# Altium footprint library 16-PCBa Modl.PcbLib: 81 footprints (part 3 of 6)
Each footprint in its own frame and in the unit in brackets; x right, y up, seen from the top. Pads: shape width x height; smd on the part's side, far side on the other; paste and mask are expansions set on the pad; w line width, h text height; cw(c..) or ccw(c..) is an arc to the next point about the centre after c.
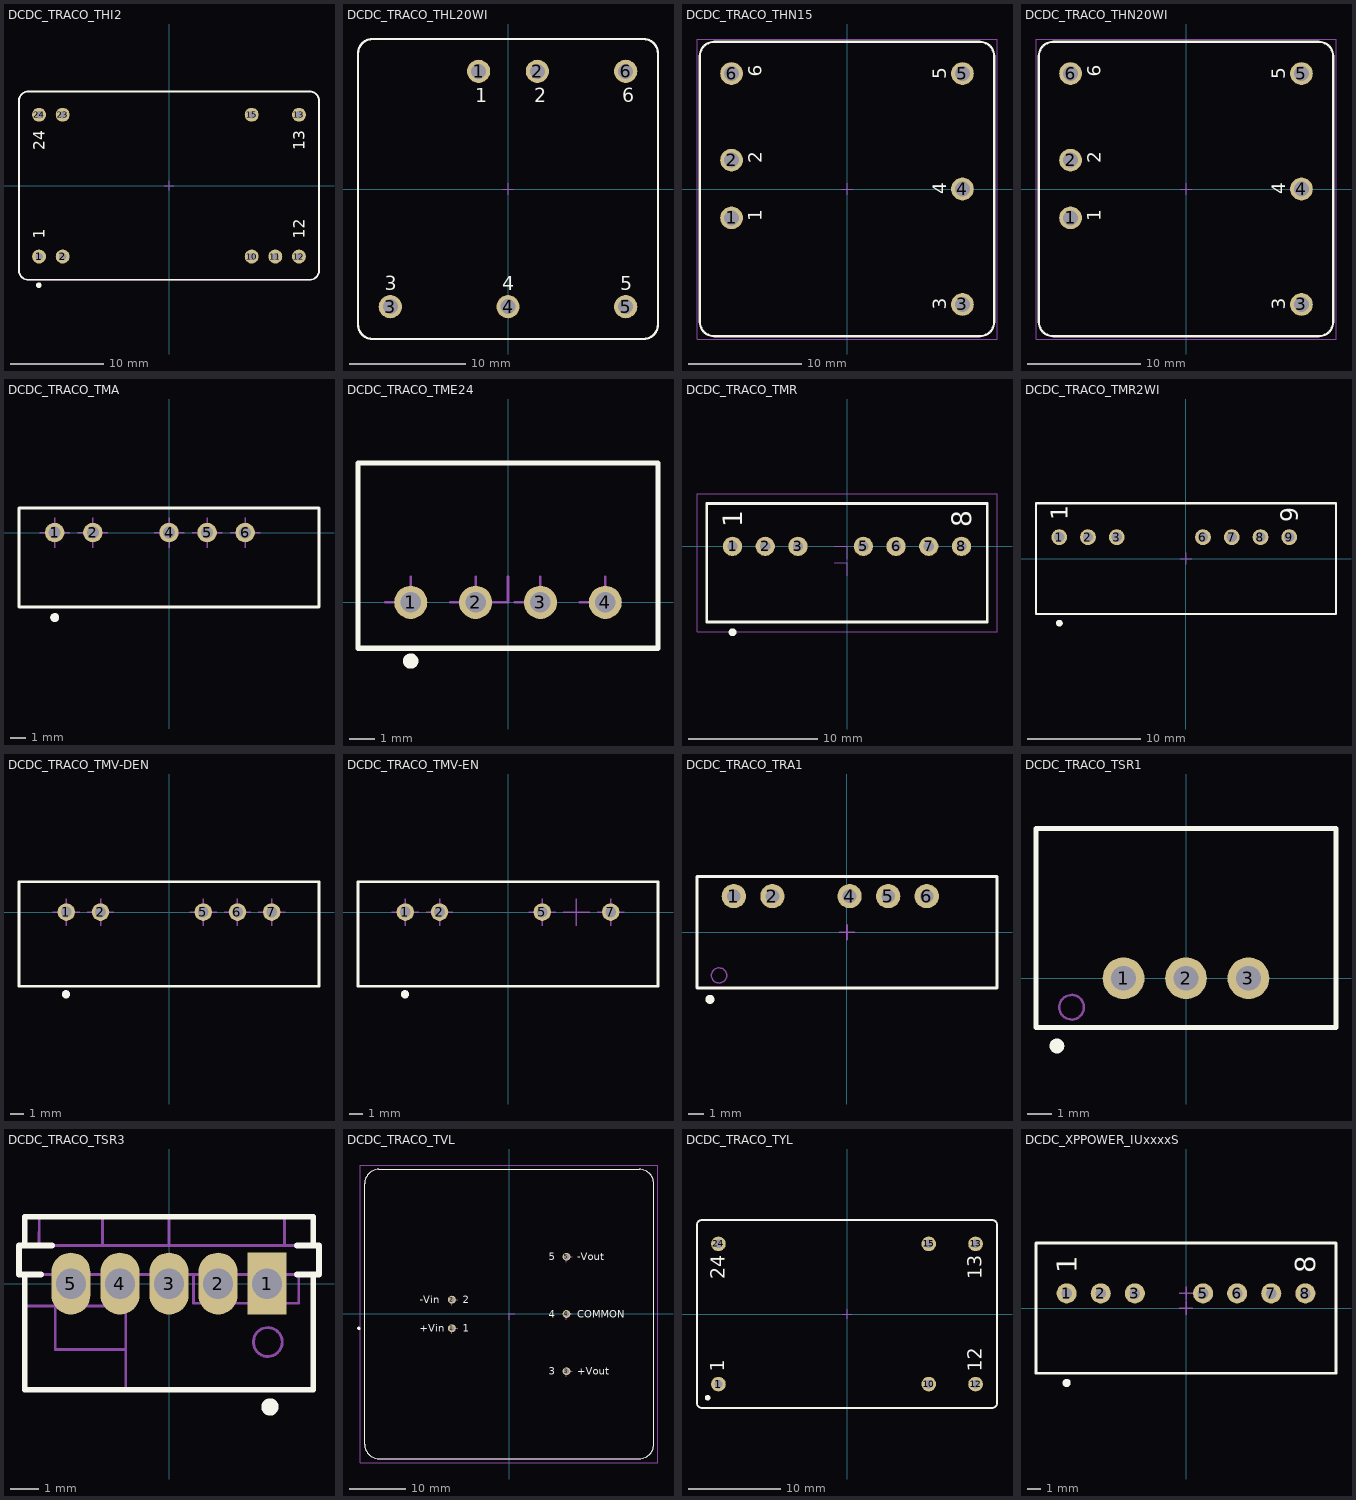
[diagram p2: the footprints below, top view; thin cyan lines are the x and y axes]

## DCDC_TRACO_THI2 [mm] "THI Series , Body 32x20mm, Pitch 2.54mm"
height 10.25
pads (9):
  round 1.5 hole 0.8: 1(-13.97,-7.62) 2(-11.43,-7.62) 10(8.89,-7.62) 11(11.43,-7.62) 12(13.97,-7.62) 13(13.97,7.62) 15(8.89,7.62) 23(-11.43,7.62) 24(-13.97,7.62)
Top Overlay:
  circle w0.3: c-14,-10.7 r0.15
  lines w0.2: -16.125,-9.125 ccw(c-15.125,-9.125) -15.125,-10.125 15.125,-10.125 ccw(c15.125,-9.125) 16.125,-9.125 16.125,9.125 ccw(c15.125,9.125) 15.125,10.125 -15.125,10.125 ccw(c-15.125,9.125) -16.125,9.125 -16.125,-9.125
  text "1" at -13.335,-5.715 h1.2
  text "13" at 14.605,3.81 h1.2
  text "24" at -13.335,3.81 h1.2
  text "12" at 14.605,-5.715 h1.2
Mechanical 8:
  lines w0.1: -14.47,-7.62 -13.97,-7.62 ; -14.47,7.62 -13.97,7.62 ; -13.97,-8.12 -13.97,-7.62 ; -13.97,-7.12 -13.97,-7.62 ; -13.97,7.12 -13.97,7.62 ; -13.97,8.12 -13.97,7.62 ; -13.47,-7.62 -13.97,-7.62 ; -13.47,7.62 -13.97,7.62 ; -11.93,-7.62 -11.43,-7.62 ; -11.93,7.62 -11.43,7.62 ; -11.43,-8.12 -11.43,-7.62 ; -11.43,-7.12 -11.43,-7.62 ; -11.43,7.12 -11.43,7.62 ; -11.43,8.12 -11.43,7.62 ; -10.93,-7.62 -11.43,-7.62 ; -10.93,7.62 -11.43,7.62 ; -0.5,0 0,0 ; 0,-0.5 0,0 ; 0,0.5 0,0 ; 0.5,0 0,0 ; 8.39,-7.62 8.89,-7.62 ; 8.39,7.62 8.89,7.62 ; 8.89,-8.12 8.89,-7.62 ; 8.89,-7.12 8.89,-7.62 ; 8.89,7.12 8.89,7.62 ; 8.89,8.12 8.89,7.62 ; 9.39,-7.62 8.89,-7.62 ; 9.39,7.62 8.89,7.62 ; 10.93,-7.62 11.43,-7.62 ; 11.43,-8.12 11.43,-7.62 ; 11.43,-7.12 11.43,-7.62 ; 11.93,-7.62 11.43,-7.62 ; 13.47,-7.62 13.97,-7.62 ; 13.47,7.62 13.97,7.62 ; 13.97,-8.12 13.97,-7.62 ; 13.97,-7.12 13.97,-7.62 ; 13.97,7.12 13.97,7.62 ; 13.97,8.12 13.97,7.62 ; 14.47,-7.62 13.97,-7.62 ; 14.47,7.62 13.97,7.62
Mechanical 14:
  lines w0.1: -16.125,-9.125 ccw(c-15.125,-9.125) -15.125,-10.125 15.125,-10.125 ccw(c15.125,-9.125) 16.125,-9.125 16.125,9.125 ccw(c15.125,9.125) 15.125,10.125 -15.125,10.125 ccw(c-15.125,9.125) -16.125,9.125 -16.125,-9.125
  text "1" at -13.335,-5.715 h1.2
  text "12" at 14.605,-5.715 h1.2
  text "13" at 14.605,3.81 h1.2
  text "24" at -13.335,3.81 h1.2
3D body "DCDC_TRACO_THI2.stp": height 10.25, standoff -3.8, extent -16.125,-10.125 16.125,10.125

## DCDC_TRACO_THL20WI [mm] "THL 20WI Series , Body 25.4x25.4mm, Height 10.7mm"
height 10.7
pads (6):
  round 2 hole 1.3: 1(-2.54,10.16) 2(2.54,10.16) 3(-10.16,-10.16) 4(0,-10.16) 5(10.16,-10.16) 6(10.16,10.16)
Top Overlay:
  lines w0.2: -12.95,-11.7 ccw(c-11.7,-11.7) -11.7,-12.95 11.7,-12.95 ccw(c11.7,-11.7) 12.95,-11.7 12.95,11.7 ccw(c11.7,11.7) 11.7,12.95 -11.7,12.95 ccw(c-11.7,11.7) -12.95,11.7 -12.95,-11.7
  text "1" at -2.819,7.486 h1.2
  text "2" at 2.261,7.486 h1.2
  text "6" at 9.881,7.486 h1.2
  text "5" at 9.677,-8.756 h1.2
  text "4" at -0.483,-8.756 h1.2
  text "3" at -10.643,-8.756 h1.2
Mechanical 8:
  lines w0.1: -10.66,-10.16 -10.16,-10.16 ; -10.16,-10.66 -10.16,-10.16 ; -10.16,-9.66 -10.16,-10.16 ; -9.66,-10.16 -10.16,-10.16 ; -3.04,10.16 -2.54,10.16 ; -2.54,9.66 -2.54,10.16 ; -2.54,10.66 -2.54,10.16 ; -2.04,10.16 -2.54,10.16 ; -0.5,-10.16 0,-10.16 ; -0.5,0 0,0 ; 0,-10.66 0,-10.16 ; 0,-9.66 0,-10.16 ; 0,-0.5 0,0 ; 0,0.5 0,0 ; 0.5,-10.16 0,-10.16 ; 0.5,0 0,0 ; 2.04,10.16 2.54,10.16 ; 2.54,9.66 2.54,10.16 ; 2.54,10.66 2.54,10.16 ; 3.04,10.16 2.54,10.16 ; 9.66,-10.16 10.16,-10.16 ; 9.66,10.16 10.16,10.16 ; 10.16,-10.66 10.16,-10.16 ; 10.16,-9.66 10.16,-10.16 ; 10.16,9.66 10.16,10.16 ; 10.16,10.66 10.16,10.16 ; 10.66,-10.16 10.16,-10.16 ; 10.66,10.16 10.16,10.16
Mechanical 14:
  lines w0.1: -12.95,-11.7 ccw(c-11.7,-11.7) -11.7,-12.95 11.7,-12.95 ccw(c11.7,-11.7) 12.95,-11.7 12.95,11.7 ccw(c11.7,11.7) 11.7,12.95 -11.7,12.95 ccw(c-11.7,11.7) -12.95,11.7 -12.95,-11.7
  text "1" at -2.819,7.486 h1.2
  text "2" at 2.261,7.486 h1.2
  text "6" at 9.881,7.486 h1.2
  text "5" at 9.677,-8.756 h1.2
  text "4" at -0.483,-8.756 h1.2
  text "3" at -10.643,-8.756 h1.2
3D body "DCDC_TRACO_THL20WI.stp": height 10.7, standoff -3.6, extent -12.95,-12.95 12.95,12.95

## DCDC_TRACO_THN15 [mm] "THN 15 Series , Body 25.4x25.4mm, Height 9.9mm"
height 9.9
pads (6):
  round 2 hole 1.3: 1(-10.16,-2.54) 2(-10.16,2.54) 3(10.16,-10.16) 4(10.16,0) 5(10.16,10.16) 6(-10.16,10.16)
Top Overlay:
  lines w0.2: -12.95,-11.7 ccw(c-11.7,-11.7) -11.7,-12.95 11.7,-12.95 ccw(c11.7,-11.7) 12.95,-11.7 12.95,11.7 ccw(c11.7,11.7) 11.7,12.95 -11.7,12.95 ccw(c-11.7,11.7) -12.95,11.7 -12.95,-11.7
  text "1" at -7.486,-2.819 h1.2
  text "2" at -7.486,2.261 h1.2
  text "6" at -7.486,9.881 h1.2
  text "5" at 8.756,9.677 h1.2
  text "4" at 8.756,-0.483 h1.2
  text "3" at 8.756,-10.643 h1.2
Mechanical 8:
  lines w0.1: -10.66,-2.54 -10.16,-2.54 ; -10.66,2.54 -10.16,2.54 ; -10.66,10.16 -10.16,10.16 ; -10.16,-3.04 -10.16,-2.54 ; -10.16,-2.04 -10.16,-2.54 ; -10.16,2.04 -10.16,2.54 ; -10.16,3.04 -10.16,2.54 ; -10.16,9.66 -10.16,10.16 ; -10.16,10.66 -10.16,10.16 ; -9.66,-2.54 -10.16,-2.54 ; -9.66,2.54 -10.16,2.54 ; -9.66,10.16 -10.16,10.16 ; -0.5,0 0,0 ; 0,-0.5 0,0 ; 0,0.5 0,0 ; 0.5,0 0,0 ; 9.66,-10.16 10.16,-10.16 ; 9.66,0 10.16,0 ; 9.66,10.16 10.16,10.16 ; 10.16,-10.66 10.16,-10.16 ; 10.16,-9.66 10.16,-10.16 ; 10.16,-0.5 10.16,0 ; 10.16,0.5 10.16,0 ; 10.16,9.66 10.16,10.16 ; 10.16,10.66 10.16,10.16 ; 10.66,-10.16 10.16,-10.16 ; 10.66,0 10.16,0 ; 10.66,10.16 10.16,10.16
Mechanical 14:
  lines w0.1: -12.95,-11.7 ccw(c-11.7,-11.7) -11.7,-12.95 11.7,-12.95 ccw(c11.7,-11.7) 12.95,-11.7 12.95,11.7 ccw(c11.7,11.7) 11.7,12.95 -11.7,12.95 ccw(c-11.7,11.7) -12.95,11.7 -12.95,-11.7
  text "1" at -7.486,-2.819 h1.2
  text "2" at -7.486,2.261 h1.2
  text "6" at -7.486,9.881 h1.2
  text "5" at 8.756,9.677 h1.2
  text "4" at 8.756,-0.483 h1.2
  text "3" at 8.756,-10.643 h1.2
Mechanical 15:
  lines w0.1: -13.2,-13.2 -13.2,13.2 13.2,13.2 13.2,-13.2 -13.2,-13.2
3D body "DCDC_TRACO_THN15.stp": height 9.9, standoff -3.6, extent -12.95,-12.95 12.95,12.95

## DCDC_TRACO_THN20WI [mm] "THN 20WI Series , Body 25.4x25.4mm, Height 9.9mm"
height 10.4
pads (6):
  round 2 hole 1.3: 1(-10.16,-2.54) 2(-10.16,2.54) 3(10.16,-10.16) 4(10.16,0) 5(10.16,10.16) 6(-10.16,10.16)
Top Overlay:
  lines w0.2: -12.95,-11.7 ccw(c-11.7,-11.7) -11.7,-12.95 11.7,-12.95 ccw(c11.7,-11.7) 12.95,-11.7 12.95,11.7 ccw(c11.7,11.7) 11.7,12.95 -11.7,12.95 ccw(c-11.7,11.7) -12.95,11.7 -12.95,-11.7
  text "3" at 8.756,-10.643 h1.2
  text "4" at 8.756,-0.483 h1.2
  text "5" at 8.756,9.677 h1.2
  text "6" at -7.486,9.881 h1.2
  text "2" at -7.486,2.261 h1.2
  text "1" at -7.486,-2.819 h1.2
Mechanical 8:
  lines w0.1: -10.66,-2.54 -10.16,-2.54 ; -10.66,2.54 -10.16,2.54 ; -10.66,10.16 -10.16,10.16 ; -10.16,-3.04 -10.16,-2.54 ; -10.16,-2.04 -10.16,-2.54 ; -10.16,2.04 -10.16,2.54 ; -10.16,3.04 -10.16,2.54 ; -10.16,9.66 -10.16,10.16 ; -10.16,10.66 -10.16,10.16 ; -9.66,-2.54 -10.16,-2.54 ; -9.66,2.54 -10.16,2.54 ; -9.66,10.16 -10.16,10.16 ; -0.5,0 0,0 ; 0,-0.5 0,0 ; 0,0.5 0,0 ; 0.5,0 0,0 ; 9.66,-10.16 10.16,-10.16 ; 9.66,0 10.16,0 ; 9.66,10.16 10.16,10.16 ; 10.16,-10.66 10.16,-10.16 ; 10.16,-9.66 10.16,-10.16 ; 10.16,-0.5 10.16,0 ; 10.16,0.5 10.16,0 ; 10.16,9.66 10.16,10.16 ; 10.16,10.66 10.16,10.16 ; 10.66,-10.16 10.16,-10.16 ; 10.66,0 10.16,0 ; 10.66,10.16 10.16,10.16
Mechanical 14:
  lines w0.1: -12.95,-11.7 ccw(c-11.7,-11.7) -11.7,-12.95 11.7,-12.95 ccw(c11.7,-11.7) 12.95,-11.7 12.95,11.7 ccw(c11.7,11.7) 11.7,12.95 -11.7,12.95 ccw(c-11.7,11.7) -12.95,11.7 -12.95,-11.7
  text "3" at 8.756,-10.643 h1.2
  text "4" at 8.756,-0.483 h1.2
  text "5" at 8.756,9.677 h1.2
  text "6" at -7.486,9.881 h1.2
  text "2" at -7.486,2.261 h1.2
  text "1" at -7.486,-2.819 h1.2
Mechanical 15:
  lines w0.1: -13.2,-13.2 13.2,-13.2 13.2,13.2 -13.2,13.2 -13.2,-13.2
3D body "DCDC_TRACO_THN20WI.stp": height 9.9, standoff -3.6, extent -12.95,-12.95 12.95,12.95

## DCDC_TRACO_TMA [mm] "TMA Series , Body 19.5x6.1mm, SIP-6, Unregulated"
height 10.45
pads (5):
  round 1.3 hole 0.8: 1(-7.62,0) 2(-5.08,0) 4(0,0) 5(2.54,0) 6(5.08,0)
Top Overlay:
  circle w0.3: c-7.62,-5.667 r0.15
  lines w0.2: -10,-4.975 -10,1.625 10,1.625 10,-4.975 -10,-4.975
Mechanical 8:
  lines w0.1: -8.62,0 -7.62,0 ; -7.62,-1 -7.62,0 ; -7.62,1 -7.62,0 ; -6.62,0 -7.62,0 ; -6.08,0 -5.08,0 ; -5.08,-1 -5.08,0 ; -5.08,1 -5.08,0 ; -4.08,0 -5.08,0 ; -1,0 0,0 ; 0,-1 0,0 ; 0,1 0,0 ; 1,0 0,0 ; 1.54,0 2.54,0 ; 2.54,-1 2.54,0 ; 2.54,1 2.54,0 ; 3.54,0 2.54,0 ; 4.08,0 5.08,0 ; 5.08,-1 5.08,0 ; 5.08,1 5.08,0 ; 6.08,0 5.08,0
Mechanical 14:
  lines w0.1: -10,-4.975 -10,1.625 10,1.625 10,-4.975 -10,-4.975
  text "1" at -6.87,-2.03 h1.5
  text "6" at 5.863,-2.157 h1.5
3D body "DCDC_TRACO_TMA.stp": height 10.45, standoff -3.2, extent -10,-4.975 10,1.725

## DCDC_TRACO_TME24 [mm] "TME Series , Body 11.75x7.25mm, SIP-4 Package"
height 10.45
pads (4):
  round 1.3 hole 0.8: 1(-3.81,0) 2(-1.27,0) 3(1.27,0) 4(3.81,0)
Top Overlay:
  circle w0.3: c-3.81,-2.3 r0.15
  lines w0.2: -5.875,-1.8 -5.875,5.45 5.875,5.45 5.875,-1.8 -5.875,-1.8
Mechanical 8:
  lines w0.1: -4.81,0 -3.81,0 -3.81,1 ; -2.27,0 -1.27,0 -1.27,1 ; -1,0 0,0 0,1 ; 0.27,0 1.27,0 1.27,1 ; 2.81,0 3.81,0 3.81,1
Mechanical 14:
  lines w0.1: -5.875,-1.8 5.875,-1.8 5.875,5.45 -5.875,5.45 -5.875,-1.8 ; -4.06,-0.125 -3.56,-0.125 -3.56,0.125 -4.06,0.125 -4.06,-0.125 ; -1.52,-0.125 -1.02,-0.125 -1.02,0.125 -1.52,0.125 -1.52,-0.125 ; 1.02,-0.125 1.52,-0.125 1.52,0.125 1.02,0.125 1.02,-0.125 ; 3.56,-0.125 4.06,-0.125 4.06,0.125 3.56,0.125 3.56,-0.125
  text "1" at -3.435,-1.408 h0.75
  text "4" at 4.185,-1.533 h0.75
  text "-Vin" at -3.435,1.27 h0.75
  text "+Vin" at -0.895,1.27 h0.75
  text "-Vout" at 1.645,1.27 h0.75
  text "+Vout" at 4.185,1.27 h0.75
3D body "DCDC_TRACO_TME24.stp": height 10.45, standoff -3.2, extent -5.875,-1.8 5.875,5.45

## DCDC_TRACO_TMR [mm] "TMR Series , Body 21.8x9.2mm, Compact SIP-8 Package"
height 11.1
pads (7):
  round 1.5 hole 0.8: 1(-8.89,0) 2(-6.35,0) 3(-3.81,0) 5(1.27,0) 6(3.81,0) 7(6.35,0) 8(8.89,0)
Top Overlay:
  circle w0.3: c-8.89,-6.667 r0.15
  lines w0.2: -10.9,-5.875 10.9,-5.875 10.9,3.325 -10.9,3.325 -10.9,-5.875
  text "8" at 9.64,1.5 h1.5
  text "1" at -8.14,1.5 h1.5
Mechanical 8:
  circle w0.05: c-8.89,0 r0.45
  lines w0.05: -9.14,0 -8.89,0 -8.89,-0.125 ; -6.6,0 -6.35,0 -6.35,-0.125 ; -4.06,0 -3.81,0 -3.81,-0.125 ; -1,-1.275 0,-1.275 0,-2.275 ; -1,0 0,0 0,-1 ; 1.02,0 1.27,0 1.27,-0.125 ; 3.56,0 3.81,0 3.81,-0.125 ; 6.1,0 6.35,0 6.35,-0.125 ; 8.64,0 8.89,0 8.89,-0.125 ; -9.14,-0.125 -9.14,0.125 -8.64,0.125 -8.64,-0.125 -9.14,-0.125 ; -6.6,-0.125 -6.1,-0.125 -6.1,0.125 -6.6,0.125 -6.6,-0.125 ; -4.06,-0.125 -3.56,-0.125 -3.56,0.125 -4.06,0.125 -4.06,-0.125 ; 1.02,-0.125 1.52,-0.125 1.52,0.125 1.02,0.125 1.02,-0.125 ; 3.56,-0.125 4.06,-0.125 4.06,0.125 3.56,0.125 3.56,-0.125 ; 6.1,-0.125 6.6,-0.125 6.6,0.125 6.1,0.125 6.1,-0.125 ; 8.64,-0.125 9.14,-0.125 9.14,0.125 8.64,0.125 8.64,-0.125
  text "2" at -5.6,1.5 h1.5
  text "3" at -3.06,1.5 h1.5
  text "5" at 2.02,1.5 h1.5
  text "6" at 4.56,1.5 h1.5
  text "7" at 7.1,1.5 h1.5
Mechanical 14:
  lines w0.1: -10.9,-5.875 10.9,-5.875 10.9,3.325 -10.9,3.325 -10.9,-5.875
  text "8" at 9.64,1.5 h1.5
  text "1" at -8.14,1.5 h1.5
Mechanical 15:
  lines w0.05: -11.65,-6.625 -11.65,4.075 11.65,4.075 11.65,-6.625 -11.65,-6.625
3D body "DCDC_TRACO_TMR.stp": height 11.1, standoff -3.6, extent -10.9,-5.875 10.9,3.325

## DCDC_TRACO_TMR2WI [mm] "TMR 2WI Series , Body 26x9.3mm, SIP-9 Package"
height 13
pads (7):
  round 1.4 hole 0.9: 1(-11.2,1.9) 2(-8.66,1.9) 3(-6.12,1.9) 6(1.5,1.9) 7(4.04,1.9) 8(6.58,1.9) 9(9.12,1.9)
Top Overlay:
  circle w0.3: c-11.185,-5.7 r0.15
  lines w0.2: -13.25,-4.9 13.25,-4.9 13.25,4.9 -13.25,4.9 -13.25,-4.9
  text "1" at -10.45,3.4 h1.5
  text "9" at 9.87,3.225 h1.5
Mechanical 8:
  lines w0.1: -11.7,1.9 -11.2,1.9 ; -11.2,1.4 -11.2,1.9 ; -11.2,2.4 -11.2,1.9 ; -10.7,1.9 -11.2,1.9 ; -9.16,1.9 -8.66,1.9 ; -8.66,1.4 -8.66,1.9 ; -8.66,2.4 -8.66,1.9 ; -8.16,1.9 -8.66,1.9 ; -6.62,1.9 -6.12,1.9 ; -6.12,1.4 -6.12,1.9 ; -6.12,2.4 -6.12,1.9 ; -5.62,1.9 -6.12,1.9 ; -0.5,0 0,0 ; 0,-0.5 0,0 ; 0,0.5 0,0 ; 0.5,0 0,0 ; 1,1.9 1.5,1.9 ; 1.5,1.4 1.5,1.9 ; 1.5,2.4 1.5,1.9 ; 2,1.9 1.5,1.9 ; 3.54,1.9 4.04,1.9 ; 4.04,1.4 4.04,1.9 ; 4.04,2.4 4.04,1.9 ; 4.54,1.9 4.04,1.9 ; 6.08,1.9 6.58,1.9 ; 6.58,1.4 6.58,1.9 ; 6.58,2.4 6.58,1.9 ; 7.08,1.9 6.58,1.9 ; 8.62,1.9 9.12,1.9 ; 9.12,1.4 9.12,1.9 ; 9.12,2.4 9.12,1.9 ; 9.62,1.9 9.12,1.9
Mechanical 14:
  lines w0.1: -13.25,-4.9 13.25,-4.9 13.25,4.9 -13.25,4.9 -13.25,-4.9
  text "1" at -10.45,3.4 h1.5
  text "9" at 9.87,3.225 h1.5
3D body "DCDC_TRACO_TMR2WI.stp": height 13, standoff -3.2, extent -13.25,-4.9 13.25,4.9

## DCDC_TRACO_TMV-DEN [mm] "TMV Series, Dual Output DC/DC Converter,  Body 22x7.5mm"
height 12.75
pads (5):
  round 1.3 hole 0.8: 1(-7.62,0) 2(-5.08,0) 5(2.54,0) 6(5.08,0) 7(7.62,0)
Top Overlay:
  circle w0.3: c-7.643,-6.096 r0.15
  lines w0.2: -11.125,-5.5 11.125,-5.5 11.125,2.25 -11.125,2.25 -11.125,-5.5
Mechanical 8:
  lines w0.1: -8.62,0 -7.62,0 ; -7.62,-1 -7.62,0 ; -7.62,1 -7.62,0 ; -6.62,0 -7.62,0 ; -6.08,0 -5.08,0 ; -5.08,-1 -5.08,0 ; -5.08,1 -5.08,0 ; -4.08,0 -5.08,0 ; 1.54,0 2.54,0 ; 2.54,-1 2.54,0 ; 2.54,1 2.54,0 ; 3.54,0 2.54,0 ; 4.08,0 5.08,0 ; 5.08,-1 5.08,0 ; 5.08,1 5.08,0 ; 6.08,0 5.08,0 ; 6.62,0 7.62,0 ; 7.62,-1 7.62,0 ; 7.62,1 7.62,0 ; 8.62,0 7.62,0
Mechanical 14:
  lines w0.1: -11.125,-5.5 11.125,-5.5 11.125,2.25 -11.125,2.25 -11.125,-5.5
  text "7" at 8.382,-2.159 h1.5
  text "1" at -6.87,-2.03 h1.5
Mechanical 15:
  lines w0.1: -8.62,0 -7.62,0 ; -7.62,-1 -7.62,0 ; -7.62,1 -7.62,0 ; -6.62,0 -7.62,0 ; -6.08,0 -5.08,0 ; -5.08,-1 -5.08,0 ; -5.08,1 -5.08,0 ; -4.08,0 -5.08,0 ; 1.54,0 2.54,0 ; 2.54,-1 2.54,0 ; 2.54,1 2.54,0 ; 3.54,0 2.54,0 ; 4.08,0 5.08,0 ; 5.08,-1 5.08,0 ; 5.08,1 5.08,0 ; 6.08,0 5.08,0
3D body "DCDC_TRACO_TMV-DEN.stp": height 12.75, standoff -3.5, extent -11.125,-5.5 11.125,2.25

## DCDC_TRACO_TMV-EN [mm] "TMV Series, Single Output DC/DC Converter,  Body 22x7.5mm"
height 12.75
pads (4):
  round 1.3 hole 0.8: 1(-7.62,0) 2(-5.08,0) 5(2.54,0) 7(7.62,0)
Top Overlay:
  circle w0.3: c-7.643,-6.096 r0.15
  lines w0.2: -11.125,-5.5 11.125,-5.5 11.125,2.25 -11.125,2.25 -11.125,-5.5
Mechanical 8:
  lines w0.1: -8.62,0 -7.62,0 ; -7.62,-1 -7.62,0 ; -7.62,1 -7.62,0 ; -6.62,0 -7.62,0 ; -6.08,0 -5.08,0 ; -5.08,-1 -5.08,0 ; -5.08,1 -5.08,0 ; -4.08,0 -5.08,0 ; 1.54,0 2.54,0 ; 2.54,-1 2.54,0 ; 2.54,1 2.54,0 ; 3.54,0 2.54,0 ; 4.08,0 5.08,0 ; 5.08,-1 5.08,0 ; 5.08,1 5.08,0 ; 6.08,0 5.08,0 ; 6.62,0 7.62,0 ; 7.62,-1 7.62,0 ; 7.62,1 7.62,0 ; 8.62,0 7.62,0
Mechanical 14:
  lines w0.1: -11.125,-5.5 11.125,-5.5 11.125,2.25 -11.125,2.25 -11.125,-5.5
  text "7" at 8.382,-2.159 h1.5
  text "1" at -6.87,-2.03 h1.5
Mechanical 15:
  lines w0.1: -8.62,0 -7.62,0 ; -7.62,-1 -7.62,0 ; -7.62,1 -7.62,0 ; -6.62,0 -7.62,0 ; -6.08,0 -5.08,0 ; -5.08,-1 -5.08,0 ; -5.08,1 -5.08,0 ; -4.08,0 -5.08,0 ; 1.54,0 2.54,0 ; 2.54,-1 2.54,0 ; 2.54,1 2.54,0 ; 3.54,0 2.54,0
3D body "DCDC_TRACO_TMV-EN.stp": height 12.75, standoff -3.5, extent -11.125,-5.5 11.125,2.25

## DCDC_TRACO_TRA1 [mm] "TRA1 Series , Body 19.5x7.1mm"
height 10.2
pads (5):
  round 1.6 hole 0.9: 1(-7.45,2.375) 2(-4.91,2.375) 4(0.17,2.375) 5(2.71,2.375) 6(5.25,2.375)
Top Overlay:
  circle w0.3: c-9.025,-4.425 r0.15
  lines w0.2: -9.875,-3.675 -9.875,3.675 9.875,3.675 9.875,-3.675 -9.875,-3.675
Mechanical 8:
  lines w0.1: -7.95,2.375 -7.45,2.375 ; -7.45,1.875 -7.45,2.375 ; -7.45,2.875 -7.45,2.375 ; -6.95,2.375 -7.45,2.375 ; -5.41,2.375 -4.91,2.375 ; -4.91,1.875 -4.91,2.375 ; -4.91,2.875 -4.91,2.375 ; -4.41,2.375 -4.91,2.375 ; -0.5,0 0,0 ; -0.33,2.375 0.17,2.375 ; 0,-0.5 0,0 ; 0,0.5 0,0 ; 0.17,1.875 0.17,2.375 ; 0.17,2.875 0.17,2.375 ; 0.5,0 0,0 ; 0.67,2.375 0.17,2.375 ; 2.21,2.375 2.71,2.375 ; 2.71,1.875 2.71,2.375 ; 2.71,2.875 2.71,2.375 ; 3.21,2.375 2.71,2.375 ; 4.75,2.375 5.25,2.375 ; 5.25,1.875 5.25,2.375 ; 5.25,2.875 5.25,2.375 ; 5.75,2.375 5.25,2.375
Mechanical 14:
  circle w0.1: c-8.425,-2.85 r0.5
  lines w0.1: -9.875,-3.675 -9.875,3.675 9.875,3.675 9.875,-3.675 -9.875,-3.675
3D body "DCDC_TRACO_TRA1.stp": height 10.45, standoff -3.6, extent -9.875,-3.675 9.875,3.675

## DCDC_TRACO_TSR1 [mm] "TMV Series, Single Output DC/DC Converter,  Body 22x7.5mm"
height 12.75
pads (3):
  round 1.7 hole 1: 1(-2.54,0) 2(0,0) 3(2.54,0)
Top Overlay:
  circle w0.3: c-5.25,-2.75 r0.15
  lines w0.2: -6.1,-2 -6.1,6.1 6.1,6.1 6.1,-2 -6.1,-2
Mechanical 8:
  lines w0.1: -3.04,0 -2.54,0 ; -2.54,-0.5 -2.54,0 ; -2.54,0.5 -2.54,0 ; -2.04,0 -2.54,0 ; -0.5,0 0,0 ; 0,-0.5 0,0 ; 0,0.5 0,0 ; 0.5,0 0,0 ; 2.04,0 2.54,0 ; 2.54,-0.5 2.54,0 ; 2.54,0.5 2.54,0 ; 3.04,0 2.54,0
Mechanical 14:
  circle w0.1: c-4.65,-1.175 r0.5
  lines w0.1: -6.1,-2 -6.1,6.1 6.1,6.1 6.1,-2 -6.1,-2
3D body "DCDC_TRACO_TSR1.stp": height 10.7, standoff -3.6, extent -6.1,-2.05 6.1,6.1

## DCDC_TRACO_TSR3 [mm] "TRACO TSR-3, DC/DC Converter,  Body W 6mm x L 10.4mm x H 15.5mm"
height 16
pads (5):
  rect 1.35x2.15 hole 1.05: 1(3.4,0)
  oval 1.35x2.15 hole 1.05: 2(1.7,0) 3(0,0) 4(-1.7,0) 5(-3.4,0)
Top Overlay:
  circle w0.3: c3.5,-4.275 r0.15
  lines w0.2: -5,0.32 -5,-3.68 5,-3.68 5,0.32 ; -5,1.32 -5,2.32 5,2.32 5,1.32 ; -4.436,0.32 -5.2,0.32 -5.2,1.32 -4.058,1.32 ; 4.436,0.32 5.2,0.32 5.2,1.32 4.436,1.32
Mechanical 8:
  lines w0.1: -3.9,0 -3.4,0 ; -3.4,-0.5 -3.4,0 ; -3.4,0.5 -3.4,0 ; -2.9,0 -3.4,0 ; -2.2,0 -1.7,0 ; -1.7,-0.5 -1.7,0 ; -1.7,0.5 -1.7,0 ; -1.2,0 -1.7,0 ; -0.5,0 0,0 ; 0,-0.5 0,0 ; 0,0.5 0,0 ; 0.5,0 0,0 ; 1.2,0 1.7,0 ; 1.7,-0.5 1.7,0 ; 1.7,0.5 1.7,0 ; 2.2,0 1.7,0 ; 2.9,0 3.4,0 ; 3.4,-0.5 3.4,0 ; 3.4,0.5 3.4,0 ; 3.9,0 3.4,0
Mechanical 14:
  circle w0.1: c3.425,-2.025 r0.5
  lines w0.1: -5.001,0.32 -5.001,-0.78 -1.35,-0.78 -1.35,0.32 ; -4.5,1.32 -4.5,2.32 -2.3,2.32 -2.3,1.32 ; -3.944,-0.78 -3.944,-2.28 -1.5,-2.28 ; -1.5,-3.68 5,-3.68 5,0.32 ; -1.5,-3.63 -1.5,-0.78 ; 0,1.32 0,2.32 4,2.32 4,1.32 ; 0.856,0.32 0.856,-0.68 4.5,-0.68 4.5,0.32 ; -5.2,0.32 5.2,0.32 5.2,1.32 -5.2,1.32 -5.2,0.32
3D body "DCDC_TRACO_TSR3.stp": height 15.5, standoff -3.3, extent -5.2,-3.68 5.2,2.32

## DCDC_TRACO_TVL [mm] "TVL Series , Body 51.3x51.3mm"
height 9.8
pads (5):
  round 1.4 hole 0.9: 1(-10.16,-2.54) 2(-10.16,2.54) 3(10.16,-10.16) 4(10.16,0) 5(10.16,10.16)
Top Overlay:
  circle w0.3: c-26.67,-2.54 r0.15
  lines w0.2: -25.65,-23.11 ccw(c-23.11,-23.11) -23.11,-25.65 23.11,-25.65 ccw(c23.11,-23.11) 25.65,-23.11 25.65,23.11 ccw(c23.11,23.11) 23.11,25.65 -23.11,25.65 ccw(c-23.11,23.11) -25.65,23.11 -25.65,-23.11
  text "+Vin" at -15.875,-3.175 h1.27
  text "+Vout" at 12.065,-10.795 h1.27
  text "3" at 6.985,-10.795 h1.27
  text "2" at -8.255,1.905 h1.27
  text "1" at -8.255,-3.175 h1.27
  text "5" at 6.985,9.525 h1.27
  text "4" at 6.985,-0.635 h1.27
  text "-Vin" at -15.875,1.905 h1.27
  text "COMMON" at 12.065,-0.635 h1.27
  text "-Vout" at 12.065,9.525 h1.27
Mechanical 8:
  circle w0.1: c10.16,-10.16 r0.3
  circle w0.1: c10.16,0 r0.3
  circle w0.1: c10.16,10.16 r0.3
  circle w0.1: c-10.16,2.54 r0.3
  circle w0.1: c-10.16,2.54 r0.5
  circle w0.1: c10.16,-10.16 r0.5
  circle w0.1: c10.16,0 r0.5
  circle w0.1: c10.16,10.16 r0.5
  lines w0.1: -10.16,-3.54 -10.16,-2.54 -9.16,-2.54 ; -10.16,1.54 -10.16,2.54 -9.16,2.54 ; 0,-1 0,0 1,0 ; 10.16,-11.16 10.16,-10.16 11.16,-10.16 ; 10.16,-1 10.16,0 11.16,0 ; 10.16,9.16 10.16,10.16 11.16,10.16 ; -10.66,-2.54 ccw(c-10.16,-2.54) -10.16,-3.04 ccw(c-10.16,-2.54) -9.66,-2.54 ccw(c-10.16,-2.54) -10.16,-2.04 ccw(c-10.16,-2.54) -10.66,-2.54 ; -10.46,-2.54 ccw(c-10.16,-2.54) -10.16,-2.84 ccw(c-10.16,-2.54) -9.86,-2.54 ccw(c-10.16,-2.54) -10.16,-2.24 ccw(c-10.16,-2.54) -10.46,-2.54
Mechanical 14:
  lines w0.1: -25.65,-23.11 ccw(c-23.11,-23.11) -23.11,-25.65 23.11,-25.65 ccw(c23.11,-23.11) 25.65,-23.11 25.65,23.11 ccw(c23.11,23.11) 23.11,25.65 -23.11,25.65 ccw(c-23.11,23.11) -25.65,23.11 -25.65,-23.11
  text "+Vin" at -15.875,-3.175 h1.27
  text "+Vout" at 12.065,-10.795 h1.27
  text "3" at 6.985,-10.795 h1.27
  text "2" at -8.255,1.905 h1.27
  text "1" at -8.255,-3.175 h1.27
  text "5" at 6.985,9.525 h1.27
  text "4" at 6.985,-0.635 h1.27
  text "-Vin" at -15.875,1.905 h1.27
  text "COMMON" at 12.065,-0.635 h1.27
  text "-Vout" at 12.065,9.525 h1.27
Mechanical 15:
  lines w0.05: -26.4,-26.4 -26.4,26.4 26.4,26.4 26.4,-26.4 -26.4,-26.4
3D body "DCDC_TRACO_TVL.stp": height 9.8, standoff -4.2, extent -25.65,-25.65 25.65,25.65

## DCDC_TRACO_TYL [mm] "TYL Series , Body 32.6x20.4mm"
height 10.8
pads (6):
  round 1.6 hole 0.9: 1(-13.97,-7.62) 10(8.89,-7.62) 12(13.97,-7.62) 13(13.97,7.62) 15(8.89,7.62) 24(-13.97,7.62)
Top Overlay:
  circle w0.3: c-15.15,-9.1 r0.15
  lines w0.2: -16.3,-9.7 ccw(c-15.8,-9.7) -15.8,-10.2 15.8,-10.2 ccw(c15.8,-9.7) 16.3,-9.7 16.3,9.7 ccw(c15.8,9.7) 15.8,10.2 -15.8,10.2 ccw(c-15.8,9.7) -16.3,9.7 -16.3,-9.7
  text "12" at 14.62,-6.251 h1.5
  text "13" at 14.65,3.769 h1.5
  text "1" at -13.32,-6.251 h1.5
  text "24" at -13.29,3.769 h1.5
Mechanical 8:
  lines w0.1: -14.47,-7.62 -13.97,-7.62 ; -14.47,7.62 -13.97,7.62 ; -13.97,-8.12 -13.97,-7.62 ; -13.97,-7.12 -13.97,-7.62 ; -13.97,7.12 -13.97,7.62 ; -13.97,8.12 -13.97,7.62 ; -13.47,-7.62 -13.97,-7.62 ; -13.47,7.62 -13.97,7.62 ; -0.5,0 0,0 ; 0,-0.5 0,0 ; 0,0.5 0,0 ; 0.5,0 0,0 ; 8.39,-7.62 8.89,-7.62 ; 8.39,7.62 8.89,7.62 ; 8.89,-8.12 8.89,-7.62 ; 8.89,-7.12 8.89,-7.62 ; 8.89,7.12 8.89,7.62 ; 8.89,8.12 8.89,7.62 ; 9.39,-7.62 8.89,-7.62 ; 9.39,7.62 8.89,7.62 ; 13.47,-7.62 13.97,-7.62 ; 13.47,7.62 13.97,7.62 ; 13.97,-8.12 13.97,-7.62 ; 13.97,-7.12 13.97,-7.62 ; 13.97,7.12 13.97,7.62 ; 13.97,8.12 13.97,7.62 ; 14.47,-7.62 13.97,-7.62 ; 14.47,7.62 13.97,7.62
Mechanical 14:
  lines w0.1: -16.3,-9.7 ccw(c-15.8,-9.7) -15.8,-10.2 15.8,-10.2 ccw(c15.8,-9.7) 16.3,-9.7 16.3,9.7 ccw(c15.8,9.7) 15.8,10.2 -15.8,10.2 ccw(c-15.8,9.7) -16.3,9.7 -16.3,-9.7
  text "12" at 14.62,-6.251 h1.5
  text "13" at 14.65,3.769 h1.5
  text "1" at -13.32,-6.251 h1.5
  text "24" at -13.29,3.769 h1.5
3D body "DCDC_TRACO_TYL.stp": height 10.85, standoff -3.6, extent -16.3,-10.2 16.3,10.2

## DCDC_XPPOWER_IUxxxxS [mm] "SIP-8 Package DC-DC Converter, Body 21.85x9.2mm, IU Serie"
height 11.6
pads (7):
  round 1.5 hole 0.8: 1(-8.89,1.1) 2(-6.35,1.1) 3(-3.81,1.1) 5(1.27,1.1) 6(3.81,1.1) 7(6.35,1.1) 8(8.89,1.1)
Top Overlay:
  circle w0.3: c-8.89,-5.567 r0.15
  lines w0.2: -11.175,-4.85 11.175,-4.85 11.175,4.85 -11.175,4.85 -11.175,-4.85
  text "1" at -8.14,2.6 h1.5
  text "8" at 9.64,2.6 h1.5
Mechanical 8:
  lines w0.1: -9.39,1.1 -8.89,1.1 ; -8.89,0.6 -8.89,1.1 ; -8.89,1.6 -8.89,1.1 ; -8.39,1.1 -8.89,1.1 ; -6.85,1.1 -6.35,1.1 ; -6.35,0.6 -6.35,1.1 ; -6.35,1.6 -6.35,1.1 ; -5.85,1.1 -6.35,1.1 ; -4.31,1.1 -3.81,1.1 ; -3.81,0.6 -3.81,1.1 ; -3.81,1.6 -3.81,1.1 ; -3.31,1.1 -3.81,1.1 ; -0.5,0 0,0 ; -0.5,1.1 0,1.1 ; 0,-0.5 0,0 ; 0,0.5 0,0 ; 0,0.6 0,1.1 ; 0,1.6 0,1.1 ; 0.5,0 0,0 ; 0.5,1.1 0,1.1 ; 0.77,1.1 1.27,1.1 ; 1.27,0.6 1.27,1.1 ; 1.27,1.6 1.27,1.1 ; 1.77,1.1 1.27,1.1 ; 3.31,1.1 3.81,1.1 ; 3.81,0.6 3.81,1.1 ; 3.81,1.6 3.81,1.1 ; 4.31,1.1 3.81,1.1 ; 5.85,1.1 6.35,1.1 ; 6.35,0.6 6.35,1.1 ; 6.35,1.6 6.35,1.1 ; 6.85,1.1 6.35,1.1 ; 8.39,1.1 8.89,1.1 ; 8.89,0.6 8.89,1.1 ; 8.89,1.6 8.89,1.1 ; 9.39,1.1 8.89,1.1
  text "7" at 7.1,2.6 h1.5
  text "6" at 4.56,2.6 h1.5
  text "5" at 2.02,2.6 h1.5
  text "3" at -3.06,2.6 h1.5
  text "2" at -5.6,2.6 h1.5
Mechanical 14:
  lines w0.1: -11.175,-4.85 -11.175,4.85 11.175,4.85 11.175,-4.85 -11.175,-4.85
  text "1" at -8.14,2.6 h1.5
  text "8" at 9.64,2.6 h1.5
3D body "DCDC_XPPOWER_IUxxxxS.stp": height 11.6, standoff -3.05, extent -11.175,-4.85 11.175,4.85